# Altium footprint library GBA_V1.PcbLib: 43 footprints (part 3 of 3)
Each footprint in its own frame and in the unit in brackets; x right, y up, seen from the top. Pads: shape width x height; smd on the part's side, far side on the other; paste and mask are expansions set on the pad; w line width, h text height; cw(c..) or ccw(c..) is an arc to the next point about the centre after c.
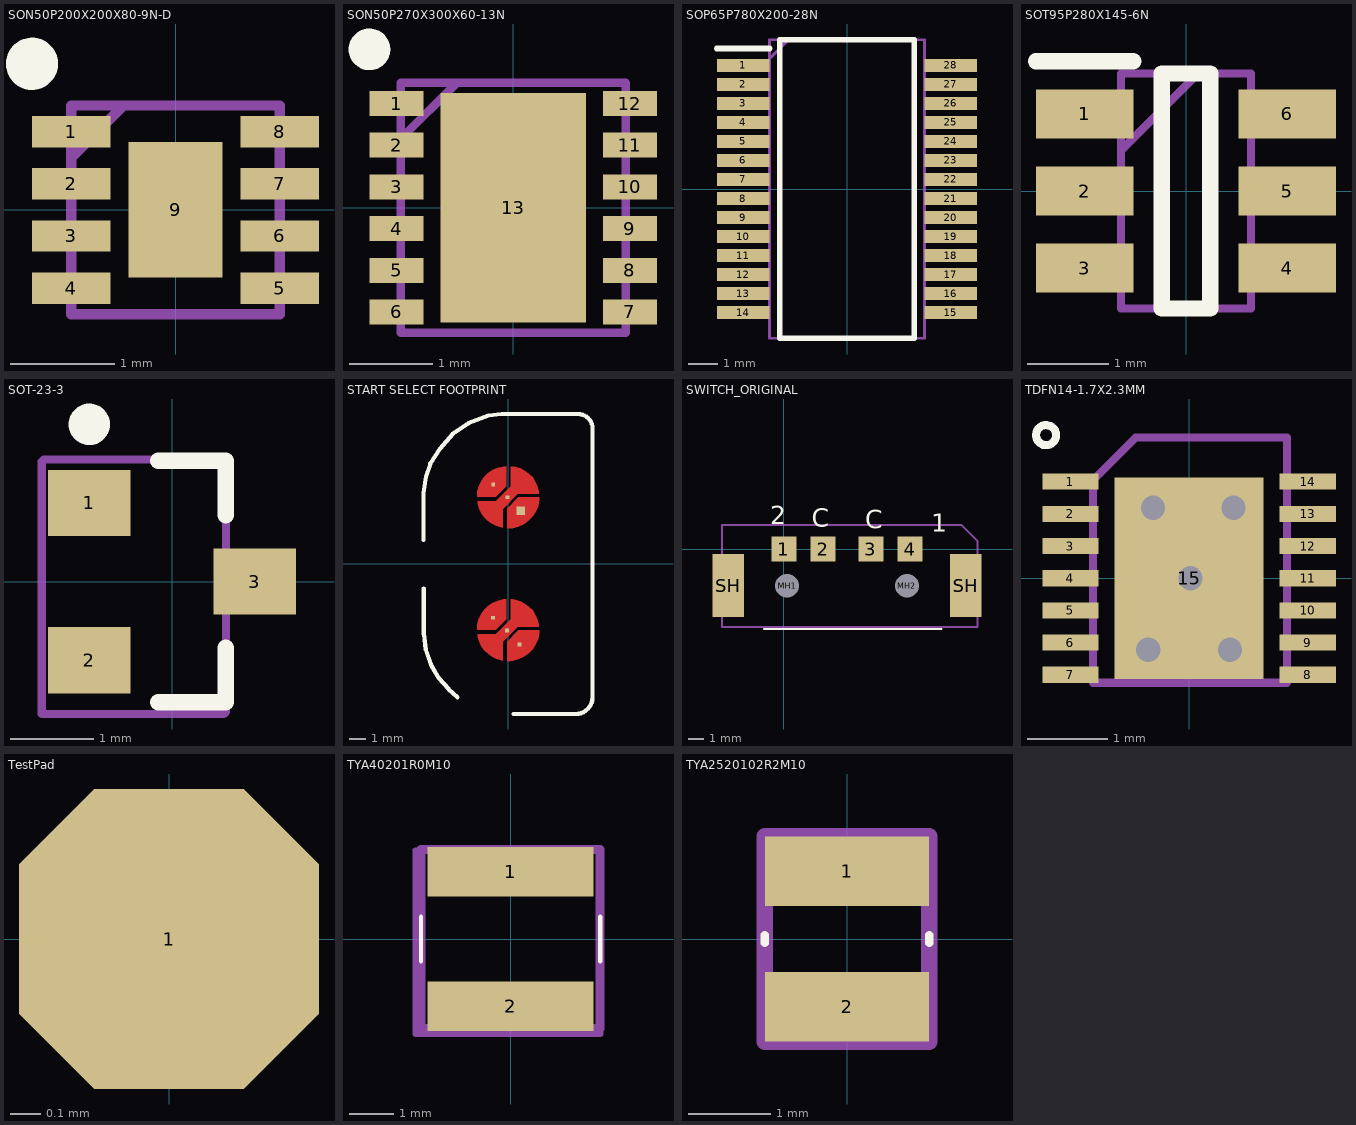
[diagram p2: the footprints below, top view; thin cyan lines are the x and y axes]

## SON50P200X200X80-9N-D [mm]
pads (9):
  rect 0.75x0.3 smd: 1(-1,0.75) 2(-1,0.25) 3(-1,-0.25) 4(-1,-0.75) 5(1,-0.75) 6(1,-0.25) 7(1,0.25) 8(1,0.75)
  rect 0.9x1.3 smd: 9(0,0)
Top Overlay:
  circle w0.25: c-1.375,1.4 r0.125
Mechanical 5:
  lines w0.1: -1,0.5 -0.5,1 ; -1,-1 -1,1 1,1 1,-1 -1,-1
  text ".Designator" at -0.889,-0.635 h1
3D body "MAX98300ETA+T.stp": height 0.8, standoff 0, extent -1.05,-1 1.05,1

## SON50P270X300X60-13N [mm]
pads (13):
  rect 0.65x0.3 smd: 1(-1.4,1.25) 2(-1.4,0.75) 3(-1.4,0.25) 4(-1.4,-0.25) 5(-1.4,-0.75) 6(-1.4,-1.25) 7(1.4,-1.25) 8(1.4,-0.75) 9(1.4,-0.25) 10(1.4,0.25) 11(1.4,0.75) 12(1.4,1.25)
  rect 1.75x2.75 smd: 13(0,0)
Top Overlay:
  circle w0.25: c-1.725,1.9 r0.125
Top Assembly:
  lines w0.1: -1.35,0.825 -0.675,1.5 ; -1.35,-1.5 -1.35,1.5 1.35,1.5 1.35,-1.5 -1.35,-1.5
  text ".Designator" at -1.397,-0.635 h1
3D body "RP604K331A-TR.stp": height 0.6, standoff 0, extent -1.4,-1.5 1.4,1.5

## SOP65P780X200-28N [mm]
pads (28):
  rect 1.8x0.45 smd: 1(-3.55,4.225) 2(-3.55,3.575) 3(-3.55,2.925) 4(-3.55,2.275) 5(-3.55,1.625) 6(-3.55,0.975) 7(-3.55,0.325) 8(-3.55,-0.325) 9(-3.55,-0.975) 10(-3.55,-1.625) 11(-3.55,-2.275) 12(-3.55,-2.925) 13(-3.55,-3.575) 14(-3.55,-4.225) 15(3.55,-4.225) 16(3.55,-3.575) 17(3.55,-2.925) 18(3.55,-2.275) 19(3.55,-1.625) 20(3.55,-0.975) 21(3.55,-0.325) 22(3.55,0.325) 23(3.55,0.975) 24(3.55,1.625) 25(3.55,2.275) 26(3.55,2.925) 27(3.55,3.575) 28(3.55,4.225)
Top Overlay:
  lines w0.2: -4.45,4.8 -2.65,4.8 ; -2.3,-5.1 -2.3,5.1 2.3,5.1 2.3,-5.1 -2.3,-5.1
Mechanical 5:
  lines w0.1: -2.65,4.45 -2,5.1 ; -2.65,-5.1 -2.65,5.1 2.65,5.1 2.65,-5.1 -2.65,-5.1
  text ".Designator" at 0.243,-1.905 h1
3D body "PCM2704CDBR.stp": height 1.9, standoff 0, extent -3.9,-5.1 3.9,5.1

## SOT95P280X145-6N [mm]
pads (6):
  rect 1.2x0.6 smd: 1(-1.25,0.95) 2(-1.25,0) 3(-1.25,-0.95) 4(1.25,-0.95) 5(1.25,0) 6(1.25,0.95)
Top Overlay:
  lines w0.2: -1.85,1.6 -0.65,1.6 ; -0.3,-1.45 -0.3,1.45 0.3,1.45 0.3,-1.45 -0.3,-1.45
Top Assembly:
  lines w0.1: -0.8,0.5 0.15,1.45 ; -0.8,-1.45 -0.8,1.45 0.8,1.45 0.8,-1.45 -0.8,-1.45
  text ".Designator" at 0.381,-1.397 h1
3D body "TPD3S014DBVR.stp": height 1.45, standoff 0, extent -1.4,-1.45 1.4,1.45

## SOT-23-3 [mm]
pads (3):
  rect 1x0.8 smd: 1(-1,0.95) 2(-1,-0.95) 3(1,0)
Top Overlay:
  circle w0.25: c-1,1.9 r0.125
  lines w0.2: -0.165,-1.46 0.65,-1.46 0.65,-0.8 ; -0.165,1.46 0.65,1.46 0.65,0.8
Top Designator:
  lines w0.1: -1.575,-1.6 0.625,-1.6 0.65,-1.575 0.65,1.475 -1.55,1.475 -1.575,1.45 -1.575,-1.6
  text ".Designator" at -0.8,1.125 h1
3D body "SOT23-3.step": height 1.3, standoff 0, extent -1.4,-1.45 1.4,1.45

## START SELECT FOOTPRINT [mm]
pads (6):
  rect 0.23x0.23 smd: GND(-0.919,-3.263) GND(-0.896,4.756) GND(0.689,-4.871) SEL(-0.069,-4.021) STR(-0.046,3.998)
  rect 0.5x0.5 smd: GND(0.762,3.175)
Top Layer:
  region: -1.868,4.014 -0.749,4.014 -0.131,4.657 -0.131,5.849 -0.295,5.842 -0.616,5.769 -0.919,5.64 -1.194,5.459 -1.432,5.231 -1.626,4.964 -1.768,4.667 -1.854,4.349 -1.868,4.185
  region: -1.846,3.753 -0.744,3.753 0.154,4.65 0.154,5.844 0.281,5.844 0.434,5.824 0.729,5.733 1.004,5.594 1.252,5.41 1.465,5.187 1.637,4.931 1.764,4.65 1.841,4.351 1.854,4.198 0.584,4.198 -0.314,3.278 -0.314,2.159 -0.453,2.183 -0.721,2.27 -0.972,2.397 -1.202,2.559 -1.406,2.753 -1.578,2.976 -1.716,3.221 -1.816,3.485 -1.846,3.622
  region: -0.053,2.13 -0.053,3.289 0.616,3.982 1.872,3.982 1.868,3.806 1.795,3.46 1.659,3.133 1.466,2.838 1.221,2.583 0.934,2.377 0.613,2.228 0.271,2.141 0.094,2.13
  region: -1.868,-3.982 -0.749,-3.982 -0.131,-3.339 -0.131,-2.148 -0.295,-2.154 -0.616,-2.227 -0.919,-2.356 -1.194,-2.537 -1.432,-2.765 -1.626,-3.032 -1.768,-3.329 -1.854,-3.647 -1.868,-3.811
  region: -1.846,-4.244 -0.744,-4.244 0.154,-3.346 0.154,-2.153 0.281,-2.153 0.434,-2.172 0.729,-2.263 1.004,-2.402 1.252,-2.586 1.465,-2.809 1.637,-3.065 1.764,-3.346 1.841,-3.645 1.854,-3.799 0.584,-3.799 -0.314,-4.718 -0.314,-5.837 -0.453,-5.813 -0.721,-5.726 -0.972,-5.599 -1.202,-5.437 -1.406,-5.243 -1.578,-5.02 -1.716,-4.775 -1.816,-4.512 -1.846,-4.374
  region: -0.053,-5.866 -0.053,-4.707 0.616,-4.014 1.872,-4.014 1.868,-4.19 1.795,-4.536 1.659,-4.862 1.466,-5.158 1.221,-5.413 0.934,-5.619 0.613,-5.768 0.271,-5.855 0.094,-5.866
Top Overlay:
  lines w0.253: -5.101,1.425 -5.101,4.251 -4.94,5.239 -4.687,6.02 -4.09,6.939 -3.332,7.812 -2.39,8.456 -1.195,8.915 -0.391,9.007 4.205,9.007 cw(c4.205,8.134) 5.078,8.134 5.078,-8.042 cw(c4.067,-8.042) 4.067,-9.053 0.322,-9.053 ; -5.078,-1.494 -5.078,-4.251 -4.963,-5.17 -4.618,-6.158 -4.182,-6.893 -3.584,-7.56 -3.056,-8.042
Mechanical 5:
  text ".Designator" at 0.635,-3.81 h2

## SWITCH_ORIGINAL [mil]
pads (8):
  rect 62.99x63 smd: 1(0,0) 2(98,0) 3(218,0) 4(316,0)
  round 50 hole 59.06 unplated: MH1(8,-91.5) MH2(308,-91.5)
  rect 78.74x157.48 smd: SH(-138.5,-91.5) SH(454.5,-91.5)
Top Overlay:
  lines w5: -50,-200 395,-200
  text "2" at -33.42,46.65 h78.74
  text "C" at 69.52,41.32 h78.74
  text "1" at 368.78,28.25 h78.74
  text "C" at 204.07,36.78 h78.74
Mechanical 5:
  lines w5: -155,-195 485,-195 485,20 445,60 -155,60 -155,-145 -155,-195
  text ".Designator" at 95,-130 h39.37

## TDFN14-1.7X2.3MM [mm]
pads (15):
  rect 0.7x0.2 smd: 1(-1.475,1.2) 2(-1.475,0.8) 3(-1.475,0.4) 4(-1.475,0) 5(-1.475,-0.4) 6(-1.475,-0.8) 7(-1.475,-1.2) 8(1.475,-1.2) 9(1.475,-0.8) 10(1.475,-0.4) 11(1.475,0) 12(1.475,0.4) 13(1.475,0.8) 14(1.475,1.2)
  rect 1.85x2.5 smd: 15(0,0)
via -0.45,0.875 diameter 0.5 hole 0.3
via 0.55,0.875 diameter 0.5 hole 0.3
via 0.015,0 diameter 0.5 hole 0.3
via 0.508,-0.889 diameter 0.5 hole 0.3
via -0.508,-0.889 diameter 0.5 hole 0.3
Top Overlay:
  circle w0.1: c-1.778,1.778 r0.125
Top Designator:
  lines w0.1: -1.195,-1.299 -1.195,1.218 -0.664,1.749 1.218,1.749 1.218,-1.299 -1.195,-1.299
  text ".Designator" at 0.329,-1.045 h1
3D body "MAXIM-TDFN-EP-14.step": height 0.73, standoff -0.03, extent -1.535,-1.5 1.475,1.5

## TestPad [mm]
pads (1):
  oct 1x1 smd paste-2: 1(0,0)

## TYA40201R0M10 [mm]
pads (2):
  rect 3.7x1.1 smd: 1(0,1.5) 2(0,-1.5)
Top Overlay:
  lines w0.1: -2,-0.5 -2,0.5 ; 2,-0.5 2,0.5
Top Assembly:
  lines w0.127: -2.121,-2.121 2.007,-2.121 2.007,1.981 -2.121,1.981 -2.121,-2.121
  text ".Designator" at -2.032,-0.508 h1
Mechanical 13:
  lines w0.2: -2,-2 -2,2 2,2 2,-2 -2,-2
3D body "TYA40201R0M-10.stp": height 2.2, standoff 0, extent -2,-2 2,2

## TYA2520102R2M10 [mm]
pads (2):
  rect 2x0.85 smd: 1(0,0.825) 2(0,-0.825)
Top Overlay:
  lines w0.1: -1,-0.05 -1,0.05 ; 1,-0.05 1,0.05
Top Assembly:
  lines w0.2: -1,-1.25 -1,1.25 1,1.25 1,-1.25 -1,-1.25
  text ".Designator" at 0.381,-1.016 h1
3D body "TYA2520102R2M-10.stp": height 1.25, standoff 0, extent -1,-1.25 1,1.25